# Altium footprint library con-molex.PCBLIB: 369 footprints (part 14 of 26)
Each footprint in its own frame and in the unit in brackets; x right, y up, seen from the top. Pads: shape width x height; smd on the part's side, far side on the other; paste and mask are expansions set on the pad; w line width, h text height; cw(c..) or ccw(c..) is an arc to the next point about the centre after c.
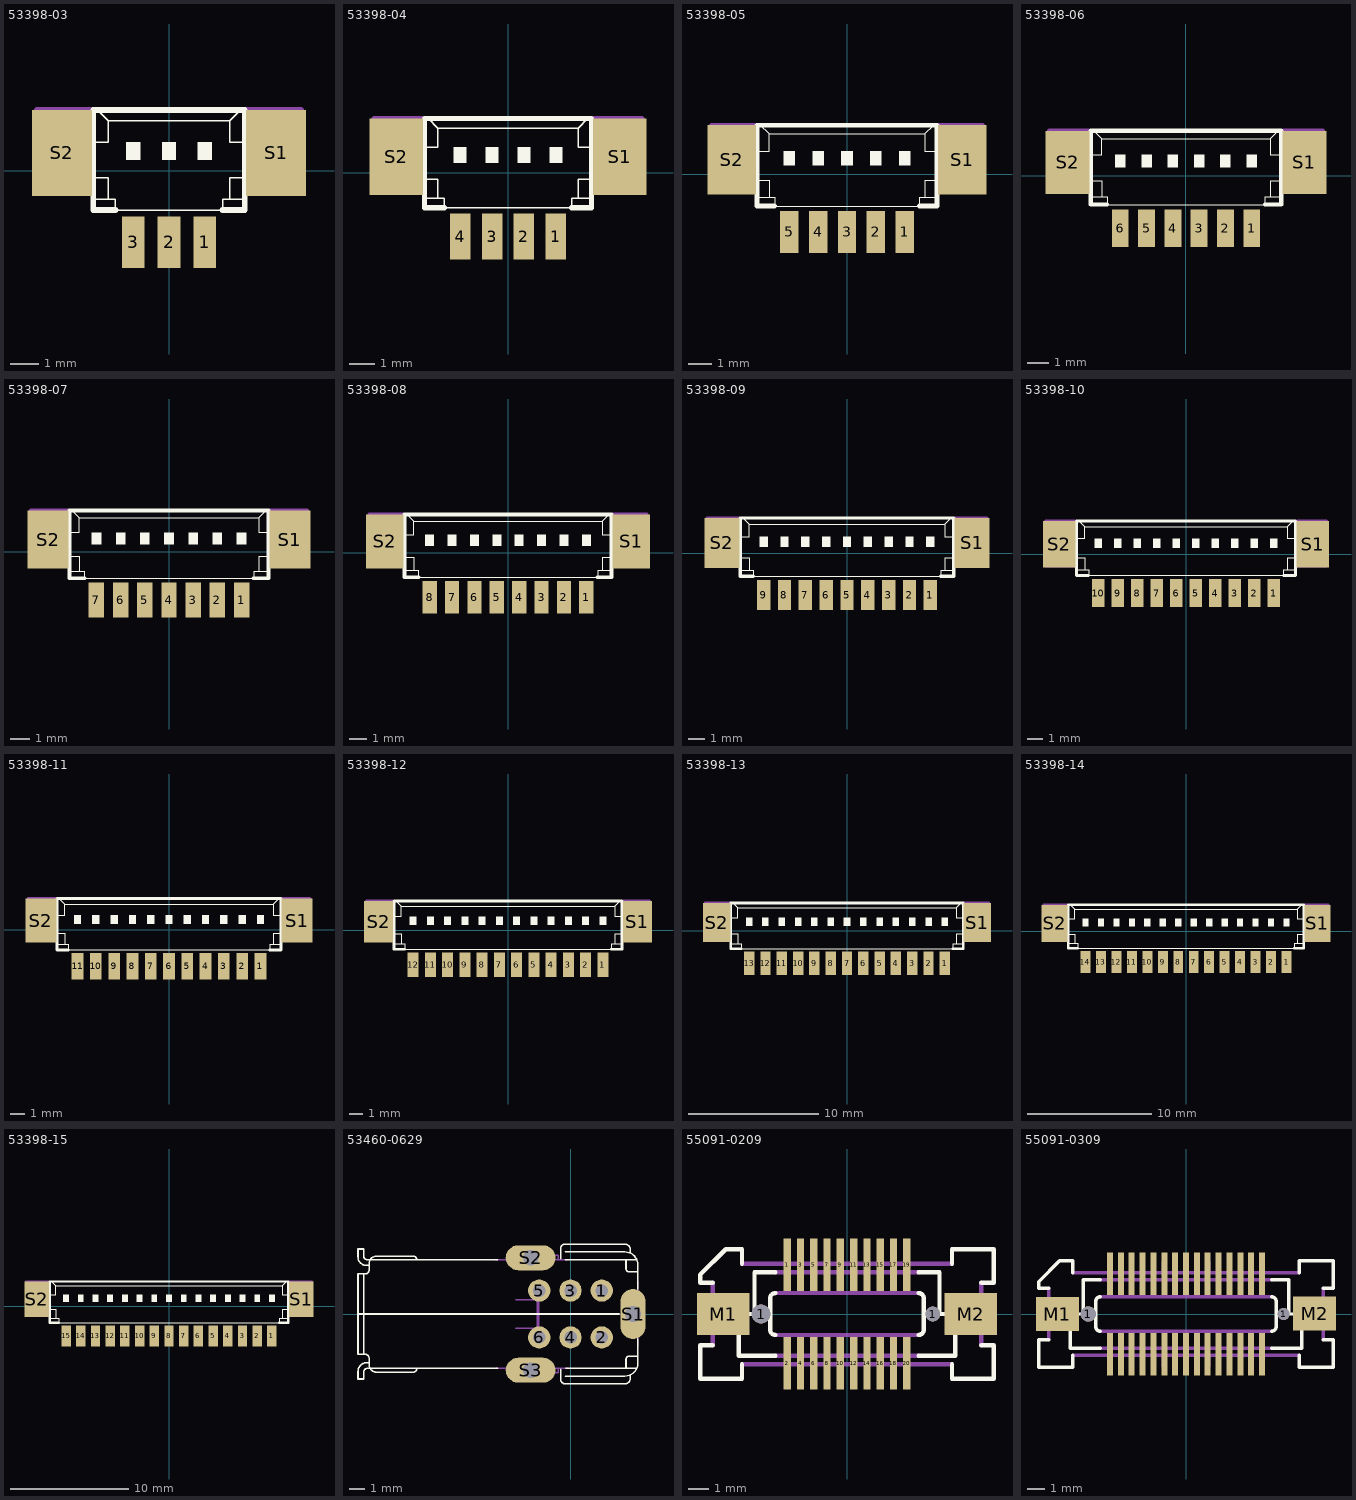
[diagram p13: the footprints below, top view; thin cyan lines are the x and y axes]

## 53398-03 [mil]
pads (5):
  rect 31.5x70.87 smd: 1(49.21,-98.43) 2(0,-98.43) 3(-49.21,-98.43)
  rect 82.68x118.11 smd: S1(147.64,24.61) S2(-147.64,24.61)
Top Overlay:
  rectangle: -59.06,14.76 -39.37,39.37
  rectangle: -9.84,14.76 9.84,39.37
  rectangle: 39.37,14.76 59.06,39.37
  lines w2: -103.35,-39.37 -83.66,-39.37 ; -103.35,-9.84 -83.66,-9.84 -83.66,-39.37 ; -103.35,39.37 -83.66,39.37 -83.66,68.9 ; -98.43,83.66 -83.66,68.9 ; 98.43,83.66 83.66,68.9 ; 103.35,-39.37 83.66,-39.37 ; 103.35,-9.84 83.66,-9.84 83.66,-39.37 ; 103.35,39.37 83.66,39.37 83.66,68.9 ; -83.66,-39.37 -73.82,-39.37 -73.82,-54.13 73.82,-54.13 73.82,-39.37 83.66,-39.37 ; -83.66,68.9 83.66,68.9
  lines w8: -73.82,-54.13 -104.33,-54.13 -104.33,83.66 -98.43,83.66 98.43,83.66 104.33,83.66 104.33,-54.13 73.82,-54.13
Mechanical 16:
  lines w8: -108.27,-29.53 -182.09,-29.53 -182.09,83.66 -108.27,83.66 ; 108.27,-29.53 182.09,-29.53 182.09,83.66 108.27,83.66
  text "1" at 123.03,-9.84 h117.8

## 53398-04 [mil]
pads (6):
  rect 31.5x70.87 smd: 1(73.82,-98.43) 2(24.61,-98.43) 3(-24.61,-98.43) 4(-73.82,-98.43)
  rect 82.68x118.11 smd: S1(172.24,24.61) S2(-172.24,24.61)
Top Overlay:
  rectangle: -83.66,14.76 -63.98,39.37
  rectangle: -34.45,14.76 -14.76,39.37
  rectangle: 14.76,14.76 34.45,39.37
  rectangle: 63.98,14.76 83.66,39.37
  lines w2: -127.95,-39.37 -108.27,-39.37 ; -127.95,-9.84 -108.27,-9.84 -108.27,-39.37 ; -127.95,39.37 -108.27,39.37 -108.27,68.9 ; -123.03,83.66 -108.27,68.9 ; 123.03,83.66 108.27,68.9 ; 127.95,-39.37 108.27,-39.37 ; 127.95,-9.84 108.27,-9.84 108.27,-39.37 ; 127.95,39.37 108.27,39.37 108.27,68.9 ; -108.27,-39.37 -98.43,-39.37 -98.43,-54.13 98.43,-54.13 98.43,-39.37 108.27,-39.37 ; -108.27,68.9 108.27,68.9
  lines w8: -98.43,-54.13 -128.94,-54.13 -128.94,83.66 -123.03,83.66 123.03,83.66 128.94,83.66 128.94,-54.13 98.43,-54.13
Mechanical 16:
  lines w8: -132.87,-29.53 -206.69,-29.53 -206.69,83.66 -132.87,83.66 ; 132.87,-29.53 206.69,-29.53 206.69,83.66 132.87,83.66
  text "1" at 147.64,-9.84 h117.8

## 53398-05 [mil]
pads (7):
  rect 31.5x70.87 smd: 1(98.43,-98.43) 2(49.21,-98.43) 3(0,-98.43) 4(-49.21,-98.43) 5(-98.43,-98.43)
  rect 82.68x118.11 smd: S1(196.85,24.61) S2(-196.85,24.61)
Top Overlay:
  rectangle: -108.27,14.76 -88.58,39.37
  rectangle: -59.06,14.76 -39.37,39.37
  rectangle: -9.84,14.76 9.84,39.37
  rectangle: 39.37,14.76 59.06,39.37
  rectangle: 88.58,14.76 108.27,39.37
  lines w2: -152.56,-39.37 -132.87,-39.37 ; -152.56,-9.84 -132.87,-9.84 -132.87,-39.37 ; -152.56,39.37 -132.87,39.37 -132.87,68.9 ; -147.64,83.66 -132.87,68.9 ; 147.64,83.66 132.87,68.9 ; 152.56,-39.37 132.87,-39.37 ; 152.56,-9.84 132.87,-9.84 132.87,-39.37 ; 152.56,39.37 132.87,39.37 132.87,68.9 ; -132.87,-39.37 -123.03,-39.37 -123.03,-54.13 123.03,-54.13 123.03,-39.37 132.87,-39.37 ; -132.87,68.9 132.87,68.9
  lines w8: -123.03,-54.13 -153.54,-54.13 -153.54,83.66 -147.64,83.66 147.64,83.66 153.54,83.66 153.54,-54.13 123.03,-54.13
Mechanical 16:
  lines w8: -157.48,-29.53 -231.3,-29.53 -231.3,83.66 -157.48,83.66 ; 157.48,-29.53 231.3,-29.53 231.3,83.66 157.48,83.66
  text "1" at 172.24,-9.84 h117.8

## 53398-06 [mil]
pads (8):
  rect 31.5x70.87 smd: 1(123.03,-98.43) 2(73.82,-98.43) 3(24.61,-98.43) 4(-24.61,-98.43) 5(-73.82,-98.43) 6(-123.03,-98.43)
  rect 82.68x118.11 smd: S1(221.46,24.61) S2(-221.46,24.61)
Top Overlay:
  rectangle: -132.87,14.76 -113.19,39.37
  rectangle: -83.66,14.76 -63.98,39.37
  rectangle: -34.45,14.76 -14.76,39.37
  rectangle: 14.76,14.76 34.45,39.37
  rectangle: 63.98,14.76 83.66,39.37
  rectangle: 113.19,14.76 132.87,39.37
  lines w2: -177.17,-39.37 -157.48,-39.37 ; -177.17,-9.84 -157.48,-9.84 -157.48,-39.37 ; -177.17,39.37 -157.48,39.37 -157.48,68.9 ; -172.24,83.66 -157.48,68.9 ; 172.24,83.66 157.48,68.9 ; 177.17,-39.37 157.48,-39.37 ; 177.17,-9.84 157.48,-9.84 157.48,-39.37 ; 177.17,39.37 157.48,39.37 157.48,68.9 ; -157.48,-39.37 -147.64,-39.37 -147.64,-54.13 147.64,-54.13 147.64,-39.37 157.48,-39.37 ; -157.48,68.9 157.48,68.9
  lines w8: -147.64,-54.13 -178.15,-54.13 -178.15,83.66 -172.24,83.66 172.24,83.66 178.15,83.66 178.15,-54.13 147.64,-54.13
Mechanical 16:
  lines w8: -182.09,-29.53 -255.91,-29.53 -255.91,83.66 -182.09,83.66 ; 182.09,-29.53 255.91,-29.53 255.91,83.66 182.09,83.66
  text "1" at 196.85,-9.84 h117.8

## 53398-07 [mil]
pads (9):
  rect 31.5x70.87 smd: 1(147.64,-98.43) 2(98.43,-98.43) 3(49.21,-98.43) 4(0,-98.43) 5(-49.21,-98.43) 6(-98.43,-98.43) 7(-147.64,-98.43)
  rect 82.68x118.11 smd: S1(246.06,24.61) S2(-246.06,24.61)
Top Overlay:
  rectangle: -157.48,14.76 -137.8,39.37
  rectangle: -108.27,14.76 -88.58,39.37
  rectangle: -59.06,14.76 -39.37,39.37
  rectangle: -9.84,14.76 9.84,39.37
  rectangle: 39.37,14.76 59.06,39.37
  rectangle: 88.58,14.76 108.27,39.37
  rectangle: 137.8,14.76 157.48,39.37
  lines w2: -201.77,-39.37 -182.09,-39.37 ; -201.77,-9.84 -182.09,-9.84 -182.09,-39.37 ; -201.77,39.37 -182.09,39.37 -182.09,68.9 ; -196.85,83.66 -182.09,68.9 ; 196.85,83.66 182.09,68.9 ; 201.77,-39.37 182.09,-39.37 ; 201.77,-9.84 182.09,-9.84 182.09,-39.37 ; 201.77,39.37 182.09,39.37 182.09,68.9 ; -182.09,-39.37 -172.24,-39.37 -172.24,-54.13 172.24,-54.13 172.24,-39.37 182.09,-39.37 ; -182.09,68.9 182.09,68.9
  lines w8: -172.24,-54.13 -202.76,-54.13 -202.76,83.66 -196.85,83.66 196.85,83.66 202.76,83.66 202.76,-54.13 172.24,-54.13
Mechanical 16:
  lines w8: -206.69,-29.53 -280.51,-29.53 -280.51,83.66 -206.69,83.66 ; 206.69,-29.53 280.51,-29.53 280.51,83.66 206.69,83.66
  text "1" at 221.46,-9.84 h117.8

## 53398-08 [mil]
pads (10):
  rect 31.5x70.87 smd: 1(172.24,-98.43) 2(123.03,-98.43) 3(73.82,-98.43) 4(24.61,-98.43) 5(-24.61,-98.43) 6(-73.82,-98.43) 7(-123.03,-98.43) 8(-172.24,-98.43)
  rect 82.68x118.11 smd: S1(270.67,24.61) S2(-270.67,24.61)
Top Overlay:
  rectangle: -182.09,14.76 -162.4,39.37
  rectangle: -132.87,14.76 -113.19,39.37
  rectangle: -83.66,14.76 -63.98,39.37
  rectangle: -34.45,14.76 -14.76,39.37
  rectangle: 14.76,14.76 34.45,39.37
  rectangle: 63.98,14.76 83.66,39.37
  rectangle: 113.19,14.76 132.87,39.37
  rectangle: 162.4,14.76 182.09,39.37
  lines w2: -226.38,-39.37 -206.69,-39.37 ; -226.38,-9.84 -206.69,-9.84 -206.69,-39.37 ; -226.38,39.37 -206.69,39.37 -206.69,68.9 ; -221.46,83.66 -206.69,68.9 ; 221.46,83.66 206.69,68.9 ; 226.38,-39.37 206.69,-39.37 ; 226.38,-9.84 206.69,-9.84 206.69,-39.37 ; 226.38,39.37 206.69,39.37 206.69,68.9 ; -206.69,-39.37 -196.85,-39.37 -196.85,-54.13 196.85,-54.13 196.85,-39.37 206.69,-39.37 ; -206.69,68.9 206.69,68.9
  lines w8: -196.85,-54.13 -227.36,-54.13 -227.36,83.66 -221.46,83.66 221.46,83.66 227.36,83.66 227.36,-54.13 196.85,-54.13
Mechanical 16:
  lines w8: -231.3,-29.53 -305.12,-29.53 -305.12,83.66 -231.3,83.66 ; 231.3,-29.53 305.12,-29.53 305.12,83.66 231.3,83.66
  text "1" at 246.06,-9.84 h117.8

## 53398-09 [mil]
pads (11):
  rect 31.5x70.87 smd: 1(196.85,-98.43) 2(147.64,-98.43) 3(98.43,-98.43) 4(49.21,-98.43) 5(0,-98.43) 6(-49.21,-98.43) 7(-98.43,-98.43) 8(-147.64,-98.43) 9(-196.85,-98.43)
  rect 82.68x118.11 smd: S1(295.28,24.61) S2(-295.28,24.61)
Top Overlay:
  rectangle: -206.69,14.76 -187.01,39.37
  rectangle: -157.48,14.76 -137.8,39.37
  rectangle: -108.27,14.76 -88.58,39.37
  rectangle: -59.06,14.76 -39.37,39.37
  rectangle: -9.84,14.76 9.84,39.37
  rectangle: 39.37,14.76 59.06,39.37
  rectangle: 88.58,14.76 108.27,39.37
  rectangle: 137.8,14.76 157.48,39.37
  rectangle: 187.01,14.76 206.69,39.37
  lines w2: -250.98,-39.37 -231.3,-39.37 ; -250.98,-9.84 -231.3,-9.84 -231.3,-39.37 ; -250.98,39.37 -231.3,39.37 -231.3,68.9 ; -246.06,83.66 -231.3,68.9 ; 246.06,83.66 231.3,68.9 ; 250.98,-39.37 231.3,-39.37 ; 250.98,-9.84 231.3,-9.84 231.3,-39.37 ; 250.98,39.37 231.3,39.37 231.3,68.9 ; -231.3,-39.37 -221.46,-39.37 -221.46,-54.13 221.46,-54.13 221.46,-39.37 231.3,-39.37 ; -231.3,68.9 231.3,68.9
  lines w8: -221.46,-54.13 -251.97,-54.13 -251.97,83.66 -246.06,83.66 246.06,83.66 251.97,83.66 251.97,-54.13 221.46,-54.13
Mechanical 16:
  lines w8: -255.91,-29.53 -329.72,-29.53 -329.72,83.66 -255.91,83.66 ; 255.91,-29.53 329.72,-29.53 329.72,83.66 255.91,83.66
  text "1" at 270.67,-9.84 h117.8

## 53398-10 [mil]
pads (12):
  rect 31.5x70.87 smd: 1(221.46,-98.43) 2(172.24,-98.43) 3(123.03,-98.43) 4(73.82,-98.43) 5(24.61,-98.43) 6(-24.61,-98.43) 7(-73.82,-98.43) 8(-123.03,-98.43) 9(-172.24,-98.43) 10(-221.46,-98.43)
  rect 82.68x118.11 smd: S1(319.88,24.61) S2(-319.88,24.61)
Top Overlay:
  rectangle: -231.3,14.76 -211.61,39.37
  rectangle: -182.09,14.76 -162.4,39.37
  rectangle: -132.87,14.76 -113.19,39.37
  rectangle: -83.66,14.76 -63.98,39.37
  rectangle: -34.45,14.76 -14.76,39.37
  rectangle: 14.76,14.76 34.45,39.37
  rectangle: 63.98,14.76 83.66,39.37
  rectangle: 113.19,14.76 132.87,39.37
  rectangle: 162.4,14.76 182.09,39.37
  rectangle: 211.61,14.76 231.3,39.37
  lines w2: -275.59,-39.37 -255.91,-39.37 ; -275.59,-9.84 -255.91,-9.84 -255.91,-39.37 ; -275.59,39.37 -255.91,39.37 -255.91,68.9 ; -270.67,83.66 -255.91,68.9 ; 270.67,83.66 255.91,68.9 ; 275.59,-39.37 255.91,-39.37 ; 275.59,-9.84 255.91,-9.84 255.91,-39.37 ; 275.59,39.37 255.91,39.37 255.91,68.9 ; -255.91,-39.37 -246.06,-39.37 -246.06,-54.13 246.06,-54.13 246.06,-39.37 255.91,-39.37 ; -255.91,68.9 255.91,68.9
  lines w8: -246.06,-54.13 -276.57,-54.13 -276.57,83.66 -270.67,83.66 270.67,83.66 276.57,83.66 276.57,-54.13 246.06,-54.13
Mechanical 16:
  lines w8: -280.51,-29.53 -354.33,-29.53 -354.33,83.66 -280.51,83.66 ; 280.51,-29.53 354.33,-29.53 354.33,83.66 280.51,83.66
  text "1" at 295.28,-9.84 h117.8

## 53398-11 [mil]
pads (13):
  rect 31.5x70.87 smd: 1(246.06,-98.43) 2(196.85,-98.43) 3(147.64,-98.43) 4(98.43,-98.43) 5(49.21,-98.43) 6(0,-98.43) 7(-49.21,-98.43) 8(-98.43,-98.43) 9(-147.64,-98.43) 10(-196.85,-98.43) 11(-246.06,-98.43)
  rect 82.68x118.11 smd: S1(344.49,24.61) S2(-344.49,24.61)
Top Overlay:
  rectangle: -255.91,14.76 -236.22,39.37
  rectangle: -206.69,14.76 -187.01,39.37
  rectangle: -157.48,14.76 -137.8,39.37
  rectangle: -108.27,14.76 -88.58,39.37
  rectangle: -59.06,14.76 -39.37,39.37
  rectangle: -9.84,14.76 9.84,39.37
  rectangle: 39.37,14.76 59.06,39.37
  rectangle: 88.58,14.76 108.27,39.37
  rectangle: 137.8,14.76 157.48,39.37
  rectangle: 187.01,14.76 206.69,39.37
  rectangle: 236.22,14.76 255.91,39.37
  lines w2: -300.2,-39.37 -280.51,-39.37 ; -300.2,-9.84 -280.51,-9.84 -280.51,-39.37 ; -300.2,39.37 -280.51,39.37 -280.51,68.9 ; -295.28,83.66 -280.51,68.9 ; 295.28,83.66 280.51,68.9 ; 300.2,-39.37 280.51,-39.37 ; 300.2,-9.84 280.51,-9.84 280.51,-39.37 ; 300.2,39.37 280.51,39.37 280.51,68.9 ; -280.51,-39.37 -270.67,-39.37 -270.67,-54.13 270.67,-54.13 270.67,-39.37 280.51,-39.37 ; -280.51,68.9 280.51,68.9
  lines w8: -270.67,-54.13 -301.18,-54.13 -301.18,83.66 -295.28,83.66 295.28,83.66 301.18,83.66 301.18,-54.13 270.67,-54.13
Mechanical 16:
  lines w8: -305.12,-29.53 -378.94,-29.53 -378.94,83.66 -305.12,83.66 ; 305.12,-29.53 378.94,-29.53 378.94,83.66 305.12,83.66
  text "1" at 319.88,-9.84 h117.8

## 53398-12 [mil]
pads (14):
  rect 31.5x70.87 smd: 1(270.67,-98.43) 2(221.46,-98.43) 3(172.24,-98.43) 4(123.03,-98.43) 5(73.82,-98.43) 6(24.61,-98.43) 7(-24.61,-98.43) 8(-73.82,-98.43) 9(-123.03,-98.43) 10(-172.24,-98.43) 11(-221.46,-98.43) 12(-270.67,-98.43)
  rect 82.68x118.11 smd: S1(369.09,24.61) S2(-369.09,24.61)
Top Overlay:
  rectangle: -280.51,14.76 -260.83,39.37
  rectangle: -231.3,14.76 -211.61,39.37
  rectangle: -182.09,14.76 -162.4,39.37
  rectangle: -132.87,14.76 -113.19,39.37
  rectangle: -83.66,14.76 -63.98,39.37
  rectangle: -34.45,14.76 -14.76,39.37
  rectangle: 14.76,14.76 34.45,39.37
  rectangle: 63.98,14.76 83.66,39.37
  rectangle: 113.19,14.76 132.87,39.37
  rectangle: 162.4,14.76 182.09,39.37
  rectangle: 211.61,14.76 231.3,39.37
  rectangle: 260.83,14.76 280.51,39.37
  lines w2: -324.8,-39.37 -305.12,-39.37 ; -324.8,-9.84 -305.12,-9.84 -305.12,-39.37 ; -324.8,39.37 -305.12,39.37 -305.12,68.9 ; -319.88,83.66 -305.12,68.9 ; 319.88,83.66 305.12,68.9 ; 324.8,-39.37 305.12,-39.37 ; 324.8,-9.84 305.12,-9.84 305.12,-39.37 ; 324.8,39.37 305.12,39.37 305.12,68.9 ; -305.12,-39.37 -295.28,-39.37 -295.28,-54.13 295.28,-54.13 295.28,-39.37 305.12,-39.37 ; -305.12,68.9 305.12,68.9
  lines w8: -295.28,-54.13 -325.79,-54.13 -325.79,83.66 -319.88,83.66 319.88,83.66 325.79,83.66 325.79,-54.13 295.28,-54.13
Mechanical 16:
  lines w8: -329.72,-29.53 -403.54,-29.53 -403.54,83.66 -329.72,83.66 ; 329.72,-29.53 403.54,-29.53 403.54,83.66 329.72,83.66
  text "1" at 344.49,-9.84 h117.8

## 53398-13 [mil]
pads (15):
  rect 31.5x70.87 smd: 1(295.28,-98.43) 2(246.06,-98.43) 3(196.85,-98.43) 4(147.64,-98.43) 5(98.43,-98.43) 6(49.21,-98.43) 7(0,-98.43) 8(-49.21,-98.43) 9(-98.43,-98.43) 10(-147.64,-98.43) 11(-196.85,-98.43) 12(-246.06,-98.43) 13(-295.28,-98.43)
  rect 82.68x118.11 smd: S1(393.7,24.61) S2(-393.7,24.61)
Top Overlay:
  rectangle: -305.12,14.76 -285.43,39.37
  rectangle: -255.91,14.76 -236.22,39.37
  rectangle: -206.69,14.76 -187.01,39.37
  rectangle: -157.48,14.76 -137.8,39.37
  rectangle: -108.27,14.76 -88.58,39.37
  rectangle: -59.06,14.76 -39.37,39.37
  rectangle: -9.84,14.76 9.84,39.37
  rectangle: 39.37,14.76 59.06,39.37
  rectangle: 88.58,14.76 108.27,39.37
  rectangle: 137.8,14.76 157.48,39.37
  rectangle: 187.01,14.76 206.69,39.37
  rectangle: 236.22,14.76 255.91,39.37
  rectangle: 285.43,14.76 305.12,39.37
  lines w2: -349.41,-39.37 -329.72,-39.37 ; -349.41,-9.84 -329.72,-9.84 -329.72,-39.37 ; -349.41,39.37 -329.72,39.37 -329.72,68.9 ; -344.49,83.66 -329.72,68.9 ; 344.49,83.66 329.72,68.9 ; 349.41,-39.37 329.72,-39.37 ; 349.41,-9.84 329.72,-9.84 329.72,-39.37 ; 349.41,39.37 329.72,39.37 329.72,68.9 ; -329.72,-39.37 -319.88,-39.37 -319.88,-54.13 319.88,-54.13 319.88,-39.37 329.72,-39.37 ; -329.72,68.9 329.72,68.9
  lines w8: -319.88,-54.13 -350.39,-54.13 -350.39,83.66 -344.49,83.66 344.49,83.66 350.39,83.66 350.39,-54.13 319.88,-54.13
Mechanical 16:
  lines w8: -354.33,-29.53 -428.15,-29.53 -428.15,83.66 -354.33,83.66 ; 354.33,-29.53 428.15,-29.53 428.15,83.66 354.33,83.66
  text "1" at 369.09,-9.84 h117.8

## 53398-14 [mil]
pads (16):
  rect 31.5x70.87 smd: 1(319.88,-98.43) 2(270.67,-98.43) 3(221.46,-98.43) 4(172.24,-98.43) 5(123.03,-98.43) 6(73.82,-98.43) 7(24.61,-98.43) 8(-24.61,-98.43) 9(-73.82,-98.43) 10(-123.03,-98.43) 11(-172.24,-98.43) 12(-221.46,-98.43) 13(-270.67,-98.43) 14(-319.88,-98.43)
  rect 82.68x118.11 smd: S1(418.31,24.61) S2(-418.31,24.61)
Top Overlay:
  rectangle: -329.72,14.76 -310.04,39.37
  rectangle: -280.51,14.76 -260.83,39.37
  rectangle: -231.3,14.76 -211.61,39.37
  rectangle: -182.09,14.76 -162.4,39.37
  rectangle: -132.87,14.76 -113.19,39.37
  rectangle: -83.66,14.76 -63.98,39.37
  rectangle: -34.45,14.76 -14.76,39.37
  rectangle: 14.76,14.76 34.45,39.37
  rectangle: 63.98,14.76 83.66,39.37
  rectangle: 113.19,14.76 132.87,39.37
  rectangle: 162.4,14.76 182.09,39.37
  rectangle: 211.61,14.76 231.3,39.37
  rectangle: 260.83,14.76 280.51,39.37
  rectangle: 310.04,14.76 329.72,39.37
  lines w2: -374.02,-39.37 -354.33,-39.37 ; -374.02,-9.84 -354.33,-9.84 -354.33,-39.37 ; -374.02,39.37 -354.33,39.37 -354.33,68.9 ; -369.09,83.66 -354.33,68.9 ; 369.09,83.66 354.33,68.9 ; 374.02,-39.37 354.33,-39.37 ; 374.02,-9.84 354.33,-9.84 354.33,-39.37 ; 374.02,39.37 354.33,39.37 354.33,68.9 ; -354.33,-39.37 -344.49,-39.37 -344.49,-54.13 344.49,-54.13 344.49,-39.37 354.33,-39.37 ; -354.33,68.9 354.33,68.9
  lines w8: -344.49,-54.13 -375,-54.13 -375,83.66 -369.09,83.66 369.09,83.66 375,83.66 375,-54.13 344.49,-54.13
Mechanical 16:
  lines w8: -378.94,-29.53 -452.76,-29.53 -452.76,83.66 -378.94,83.66 ; 378.94,-29.53 452.76,-29.53 452.76,83.66 378.94,83.66
  text "1" at 393.7,-9.84 h117.8

## 53398-15 [mil]
pads (17):
  rect 31.5x70.87 smd: 1(344.49,-98.43) 2(295.28,-98.43) 3(246.06,-98.43) 4(196.85,-98.43) 5(147.64,-98.43) 6(98.43,-98.43) 7(49.21,-98.43) 8(0,-98.43) 9(-49.21,-98.43) 10(-98.43,-98.43) 11(-147.64,-98.43) 12(-196.85,-98.43) 13(-246.06,-98.43) 14(-295.28,-98.43) 15(-344.49,-98.43)
  rect 82.68x118.11 smd: S1(442.91,24.61) S2(-442.91,24.61)
Top Overlay:
  rectangle: -354.33,14.76 -334.65,39.37
  rectangle: -305.12,14.76 -285.43,39.37
  rectangle: -255.91,14.76 -236.22,39.37
  rectangle: -206.69,14.76 -187.01,39.37
  rectangle: -157.48,14.76 -137.8,39.37
  rectangle: -108.27,14.76 -88.58,39.37
  rectangle: -59.06,14.76 -39.37,39.37
  rectangle: -9.84,14.76 9.84,39.37
  rectangle: 39.37,14.76 59.06,39.37
  rectangle: 88.58,14.76 108.27,39.37
  rectangle: 137.8,14.76 157.48,39.37
  rectangle: 187.01,14.76 206.69,39.37
  rectangle: 236.22,14.76 255.91,39.37
  rectangle: 285.43,14.76 305.12,39.37
  rectangle: 334.65,14.76 354.33,39.37
  lines w2: -398.62,-39.37 -378.94,-39.37 ; -398.62,-9.84 -378.94,-9.84 -378.94,-39.37 ; -398.62,39.37 -378.94,39.37 -378.94,68.9 ; -393.7,83.66 -378.94,68.9 ; 393.7,83.66 378.94,68.9 ; 398.62,-39.37 378.94,-39.37 ; 398.62,-9.84 378.94,-9.84 378.94,-39.37 ; 398.62,39.37 378.94,39.37 378.94,68.9 ; -378.94,-39.37 -369.09,-39.37 -369.09,-54.13 369.09,-54.13 369.09,-39.37 378.94,-39.37 ; -378.94,68.9 378.94,68.9
  lines w8: -369.09,-54.13 -378.94,-54.13 -399.61,-54.13 -399.61,83.66 -393.7,83.66 393.7,83.66 399.61,83.66 399.61,-54.13 378.94,-54.13 369.09,-54.13
Mechanical 16:
  lines w8: -403.54,-29.53 -477.36,-29.53 -477.36,83.66 -403.54,83.66 ; 403.54,-29.53 477.36,-29.53 477.36,83.66 403.54,83.66
  text "1" at 418.31,-9.84 h117.8

## 53460-0629 [mil]
pads (9):
  round 56 hole 31.5: 1(78.74,59.06) 2(78.74,-59.06) 3(0,59.06) 4(0,-59.06) 5(-78.74,59.06) 6(-78.74,-59.06)
  oval 62.99x125.98 hole 39.37: S1(157.48,0)
  oval 125.98x62.99 hole 39.37: S2(-100.39,141.73) S3(-100.39,-141.73)
Top Overlay:
  lines w4: -532.83,0 122.35,0 ; -520.8,-100.28 -520.8,99.61 ; -509.43,-122.34 -512.77,-122.34 ccw(c-512.77,-145.07) -535.5,-145.07 -535.5,-163.79 -520.8,-163.79 -520.8,-145.74 cw(c-512.11,-145.75) -512.1,-137.05 -183.53,-137.05 ; -508.76,122.35 -514.11,122.35 cw(c-514.11,143.74) -535.5,143.74 -535.5,163.8 -520.8,163.8 -520.8,145.08 ccw(c-512.77,145.09) -512.77,137.06 -183.53,137.06 ; -507.43,110.98 cw(c-517.45,110.97) -517.45,100.95 -535.5,100.96 -535.5,-101.62 -517.45,-101.62 cw(c-517.45,-111.65) -507.42,-111.65 -507.42,-128.36 ccw(c-489.37,-128.36) -489.37,-146.41 -395.78,-146.41 ccw(c-395.77,-138.38) -387.75,-138.39 ; -507.42,110.98 -507.42,127.69 ; -387.76,137.72 ccw(c-395.78,137.72) -395.78,145.74 -489.37,145.74 ccw(c-489.37,127.69) -507.42,127.69 ; -24.74,-139.06 -24.74,-165.13 ccw(c-14.03,-165.13) -14.04,-175.83 137.72,-175.83 ; -24.74,139.06 -24.74,165.13 cw(c-14.04,165.13) -14.04,175.83 137.72,175.83 cw(c137.72,163.12) 150.43,163.13 150.43,155.77 ; -13.37,-156.44 137.05,-156.44 ccw(c137.05,-123.68) 169.81,-123.68 169.81,-106.3 ; -13.37,156.44 137.05,156.44 cw(c137.05,123.68) 169.81,123.68 169.81,106.3 ; -12.77,137.06 166.47,137.06 ; -12.1,-137.05 166.47,-137.05 ; 139.72,-114.32 cw(c147.75,-114.33) 147.75,-106.3 169.81,-106.3 ; 139.73,-135.04 139.73,-114.32 ; 139.73,135.05 139.73,114.32 ccw(c147.75,114.32) 147.75,106.3 169.81,106.3 ; 150.42,-163.13 cw(c137.72,-163.13) 137.72,-175.83 ; 150.43,-163.13 150.43,-155.77 ; 169.81,-62.44 169.81,-106.3 ; 169.81,62.44 169.81,106.3 ; -507.42,127.69 -507.42,127.69 ; 137.72,-175.83 137.72,-175.83 ; 169.81,0 169.81,0
Mechanical 11:
  lines w0: -139.76,-141.73 cw(c-120.08,-141.73) -120.08,-122.05 -80.71,-122.05 cw(c-80.7,-141.74) -61.02,-141.73 cw(c-80.71,-141.73) -80.71,-161.42 -120.08,-161.42 cw(c-120.08,-141.74) -139.76,-141.73 ; -139.76,141.73 cw(c-120.08,141.74) -120.08,161.42 -80.71,161.42 cw(c-80.71,141.73) -61.02,141.73 cw(c-80.7,141.74) -80.71,122.05 -120.08,122.05 cw(c-120.08,141.73) -139.76,141.73 ; 137.8,-19.69 ccw(c157.48,-19.69) 157.48,-39.37 ccw(c157.49,-19.68) 177.17,-19.69 177.17,19.69 ccw(c157.49,19.68) 157.48,39.37 ccw(c157.48,19.69) 137.8,19.69 137.8,-19.69
Mechanical 16:
  lines w4: -187.77,137.06 -8.53,137.06 ; -187.1,-137.05 -8.53,-137.05 ; -143.07,-139.06 -143.07,-148.42 -124.35,-148.41 ccw(c-122.34,-148.41) -122.34,-150.42 -66.85,-150.42 ccw(c-66.86,-148.41) -64.85,-148.41 -30.75,-148.41 -30.75,-139.06 ; -143.07,139.06 -143.07,148.42 -124.35,148.42 cw(c-122.34,148.42) -122.34,150.43 -66.85,150.43 cw(c-66.86,148.43) -64.85,148.42 -30.75,148.42 -30.75,139.06 ; -137.72,-35.43 -80.22,-35.43 -80.22,35.43 -137.72,35.43 ; -84.24,-34.09 -84.24,33.43 ; 150.42,-37.44 150.42,-1.33 ; 150.43,-37.44 ccw(c159.12,-37.45) 159.11,-46.13 161.12,-46.13 ccw(c161.11,-37.43) 169.81,-37.44 ; 150.43,1.34 150.43,37.44 cw(c159.12,37.44) 159.11,46.13 161.12,46.13 cw(c161.12,37.44) 169.81,37.44 ; 169.81,-81.3 169.81,-37.44 ; 169.81,81.3 169.81,37.44 ; 169.81,-37.44 169.81,37.44

## 55091-0209 [mm]
pads (24):
  round 0.9 hole 0.9: 1(-4.11,0)
  rect 0.35x2.5 smd: 1(-2.857,2.35) 2(-2.857,-2.35) 3(-2.222,2.35) 4(-2.222,-2.35) 5(-1.587,2.35) 6(-1.587,-2.35) 7(-0.953,2.35) 8(-0.953,-2.35) 9(-0.318,2.35) 10(-0.318,-2.35) 11(0.318,2.35) 12(0.318,-2.35) 13(0.953,2.35) 14(0.953,-2.35) 15(1.587,2.35) 16(1.587,-2.35) 17(2.222,2.35) 18(2.222,-2.35) 19(2.857,2.35) 20(2.857,-2.35)
  round 0.7 hole 0.7: 1(4.11,0)
  rect 2.5x2 smd: M1(-5.925,0) M2(5.925,0)
Top Overlay:
  lines w0.203: -6.425,-1.5 -7.025,-1.5 -7.025,-3.1 -5.025,-3.1 -5.025,-2.4 ; -6.425,1.5 -7.025,1.5 -7.025,1.875 -5.8,3.1 -5.025,3.1 -5.025,2.4 ; -3.425,-2 -5.175,-2 -5.175,0 -4.425,0 -4.425,2 -3.425,2 ; -3.425,-1 cw(c-3.425,-0.75) -3.675,-0.75 -3.675,0.75 cw(c-3.425,0.75) -3.425,1 ; 3.425,-2 5.175,-2 5.175,0 4.425,0 4.425,2 3.425,2 ; 3.425,-1 ccw(c3.425,-0.75) 3.675,-0.75 3.675,0.75 ccw(c3.425,0.75) 3.425,1 ; 5.025,-2.4 5.025,-3.1 7.025,-3.1 7.025,-1.5 6.425,-1.5 ; 5.025,2.4 5.025,3.1 7.025,3.1 7.025,1.5 6.425,1.5
Top Solder:
  rectangle: -3.057,1.075 -2.658,3.625
  region: -2.658,-1.075 -3.057,-1.075 -3.057,-3.625 -2.658,-3.625
  rectangle: -2.422,1.075 -2.023,3.625
  region: -2.023,-1.075 -2.422,-1.075 -2.422,-3.625 -2.023,-3.625
  rectangle: -1.787,1.075 -1.388,3.625
  region: -1.388,-1.075 -1.787,-1.075 -1.787,-3.625 -1.388,-3.625
  rectangle: -1.152,1.075 -0.753,3.625
  region: -0.753,-1.075 -1.152,-1.075 -1.152,-3.625 -0.753,-3.625
  rectangle: -0.517,1.075 -0.118,3.625
  region: -0.118,-1.075 -0.517,-1.075 -0.517,-3.625 -0.118,-3.625
  rectangle: 0.118,1.075 0.517,3.625
  region: 0.517,-1.075 0.118,-1.075 0.118,-3.625 0.517,-3.625
  rectangle: 0.753,1.075 1.152,3.625
  region: 1.152,-1.075 0.753,-1.075 0.753,-3.625 1.152,-3.625
  rectangle: 1.388,1.075 1.787,3.625
  region: 1.787,-1.075 1.388,-1.075 1.388,-3.625 1.787,-3.625
  rectangle: 2.023,1.075 2.422,3.625
  region: 2.422,-1.075 2.023,-1.075 2.023,-3.625 2.422,-3.625
  rectangle: 2.658,1.075 3.057,3.625
  region: 3.057,-1.075 2.658,-1.075 2.658,-3.625 3.057,-3.625
Mechanical 16:
  rectangle: -3.008,-3.1 -2.707,-2.375
  region: -2.707,3.1 -3.008,3.1 -3.008,2.375 -2.707,2.375
  rectangle: -2.373,-3.1 -2.072,-2.375
  region: -2.072,3.1 -2.373,3.1 -2.373,2.375 -2.072,2.375
  rectangle: -1.738,-3.1 -1.437,-2.375
  region: -1.437,3.1 -1.738,3.1 -1.738,2.375 -1.437,2.375
  rectangle: -1.103,-3.1 -0.802,-2.375
  region: -0.802,3.1 -1.103,3.1 -1.103,2.375 -0.802,2.375
  rectangle: -0.468,-3.1 -0.167,-2.375
  region: -0.167,3.1 -0.468,3.1 -0.468,2.375 -0.167,2.375
  rectangle: 0.167,-3.1 0.468,-2.375
  region: 0.468,3.1 0.167,3.1 0.167,2.375 0.468,2.375
  rectangle: 0.802,-3.1 1.103,-2.375
  region: 1.103,3.1 0.802,3.1 0.802,2.375 1.103,2.375
  rectangle: 1.437,-3.1 1.738,-2.375
  region: 1.738,3.1 1.437,3.1 1.437,2.375 1.738,2.375
  rectangle: 2.072,-3.1 2.373,-2.375
  region: 2.373,3.1 2.072,3.1 2.072,2.375 2.373,2.375
  rectangle: 2.707,-3.1 3.008,-2.375
  region: 3.008,3.1 2.707,3.1 2.707,2.375 3.008,2.375
  lines w0.203: -6.425,-1.5 -6.425,1.5 ; -5.025,-2.4 5.025,-2.4 ; -5.025,2.4 5.025,2.4 ; -3.425,-2 3.425,-2 ; -3.425,-1 3.425,-1 ; -3.425,1 3.425,1 ; -3.425,2 3.425,2 ; 6.425,-1.5 6.425,1.5

## 55091-0309 [mm]
pads (34):
  round 0.9 hole 0.9: 1(-5.7,0)
  rect 0.35x2.5 smd: 1(-4.445,2.35) 2(-4.445,-2.35) 3(-3.81,2.35) 4(-3.81,-2.35) 5(-3.175,2.35) 6(-3.175,-2.35) 7(-2.54,2.35) 8(-2.54,-2.35) 9(-1.905,2.35) 10(-1.905,-2.35) 11(-1.27,2.35) 12(-1.27,-2.35) 13(-0.635,2.35) 14(-0.635,-2.35) 15(0,2.35) 16(0,-2.35) 17(0.635,2.35) 18(0.635,-2.35) 19(1.27,2.35) 20(1.27,-2.35) 21(1.905,2.35) 22(1.905,-2.35) 23(2.54,2.35) 24(2.54,-2.35) 25(3.175,2.35) 26(3.175,-2.35) 27(3.81,2.35) 28(3.81,-2.35) 29(4.445,2.35) 30(4.445,-2.35)
  round 0.7 hole 0.7: 1(5.7,0)
  rect 2.5x2 smd: M1(-7.513,0) M2(7.513,0.025)
Top Overlay:
  lines w0.203: -8.012,-1.5 -8.612,-1.5 -8.612,-3.1 -6.612,-3.1 -6.612,-2.4 ; -8.012,1.5 -8.612,1.5 -8.612,1.875 -7.388,3.1 -6.612,3.1 -6.612,2.4 ; -5.012,-2 -6.762,-2 -6.762,0 -6.012,0 -6.012,2 -5.012,2 ; -5.012,-1 cw(c-5.013,-0.75) -5.263,-0.75 -5.263,0.75 cw(c-5.013,0.75) -5.012,1 ; 5.012,-2 6.762,-2 6.762,0 6.012,0 6.012,2 5.012,2 ; 5.012,-1 ccw(c5.013,-0.75) 5.263,-0.75 5.263,0.75 ccw(c5.013,0.75) 5.012,1 ; 6.612,-2.4 6.612,-3.1 8.612,-3.1 8.612,-1.5 8.012,-1.5 ; 6.612,2.4 6.612,3.1 8.612,3.1 8.612,1.5 8.012,1.5
Top Solder:
  rectangle: -4.645,1.075 -4.245,3.625
  region: -4.245,-1.075 -4.645,-1.075 -4.645,-3.625 -4.245,-3.625
  rectangle: -4.01,1.075 -3.61,3.625
  region: -3.61,-1.075 -4.01,-1.075 -4.01,-3.625 -3.61,-3.625
  rectangle: -3.375,1.075 -2.975,3.625
  region: -2.975,-1.075 -3.375,-1.075 -3.375,-3.625 -2.975,-3.625
  rectangle: -2.74,1.075 -2.34,3.625
  region: -2.34,-1.075 -2.74,-1.075 -2.74,-3.625 -2.34,-3.625
  rectangle: -2.105,1.075 -1.705,3.625
  region: -1.705,-1.075 -2.105,-1.075 -2.105,-3.625 -1.705,-3.625
  rectangle: -1.47,1.075 -1.07,3.625
  region: -1.07,-1.075 -1.47,-1.075 -1.47,-3.625 -1.07,-3.625
  rectangle: -0.835,1.075 -0.435,3.625
  region: -0.435,-1.075 -0.835,-1.075 -0.835,-3.625 -0.435,-3.625
  rectangle: -0.2,1.075 0.2,3.625
  region: 0.2,-1.075 -0.2,-1.075 -0.2,-3.625 0.2,-3.625
  rectangle: 0.435,1.075 0.835,3.625
  region: 0.835,-1.075 0.435,-1.075 0.435,-3.625 0.835,-3.625
  rectangle: 1.07,1.075 1.47,3.625
  region: 1.47,-1.075 1.07,-1.075 1.07,-3.625 1.47,-3.625
  rectangle: 1.705,1.075 2.105,3.625
  region: 2.105,-1.075 1.705,-1.075 1.705,-3.625 2.105,-3.625
  rectangle: 2.34,1.075 2.74,3.625
  region: 2.74,-1.075 2.34,-1.075 2.34,-3.625 2.74,-3.625
  rectangle: 2.975,1.075 3.375,3.625
  region: 3.375,-1.075 2.975,-1.075 2.975,-3.625 3.375,-3.625
  rectangle: 3.61,1.075 4.01,3.625
  region: 4.01,-1.075 3.61,-1.075 3.61,-3.625 4.01,-3.625
  rectangle: 4.245,1.075 4.645,3.625
  region: 4.645,-1.075 4.245,-1.075 4.245,-3.625 4.645,-3.625
Mechanical 16:
  rectangle: -4.595,-3.1 -4.295,-2.375
  region: -4.295,3.1 -4.595,3.1 -4.595,2.375 -4.295,2.375
  rectangle: -3.96,-3.1 -3.66,-2.375
  region: -3.66,3.1 -3.96,3.1 -3.96,2.375 -3.66,2.375
  rectangle: -3.325,-3.1 -3.025,-2.375
  region: -3.025,3.1 -3.325,3.1 -3.325,2.375 -3.025,2.375
  rectangle: -2.69,-3.1 -2.39,-2.375
  region: -2.39,3.1 -2.69,3.1 -2.69,2.375 -2.39,2.375
  rectangle: -2.055,-3.1 -1.755,-2.375
  region: -1.755,3.1 -2.055,3.1 -2.055,2.375 -1.755,2.375
  rectangle: -1.42,-3.1 -1.12,-2.375
  region: -1.12,3.1 -1.42,3.1 -1.42,2.375 -1.12,2.375
  rectangle: -0.785,-3.1 -0.485,-2.375
  region: -0.485,3.1 -0.785,3.1 -0.785,2.375 -0.485,2.375
  rectangle: -0.15,-3.1 0.15,-2.375
  region: 0.15,3.1 -0.15,3.1 -0.15,2.375 0.15,2.375
  rectangle: 0.485,-3.1 0.785,-2.375
  region: 0.785,3.1 0.485,3.1 0.485,2.375 0.785,2.375
  rectangle: 1.12,-3.1 1.42,-2.375
  region: 1.42,3.1 1.12,3.1 1.12,2.375 1.42,2.375
  rectangle: 1.755,-3.1 2.055,-2.375
  region: 2.055,3.1 1.755,3.1 1.755,2.375 2.055,2.375
  rectangle: 2.39,-3.1 2.69,-2.375
  region: 2.69,3.1 2.39,3.1 2.39,2.375 2.69,2.375
  rectangle: 3.025,-3.1 3.325,-2.375
  region: 3.325,3.1 3.025,3.1 3.025,2.375 3.325,2.375
  rectangle: 3.66,-3.1 3.96,-2.375
  region: 3.96,3.1 3.66,3.1 3.66,2.375 3.96,2.375
  rectangle: 4.295,-3.1 4.595,-2.375
  region: 4.595,3.1 4.295,3.1 4.295,2.375 4.595,2.375
  lines w0.203: -8.012,-1.5 -8.012,1.5 ; -6.612,-2.4 6.612,-2.4 ; -6.612,2.4 6.612,2.4 ; -5.012,-2 5.012,-2 ; -5.012,-1 5.012,-1 ; -5.012,1 5.012,1 ; -5.012,2 5.012,2 ; 8.012,-1.5 8.012,1.5